# Altium schematic symbol library FPGA_Xilinx_Virtex6.SchLib: 28 symbols (part 1 of 15) (continued)
## XC6VHX255T-FF1155 (continued)
part K pins: A3 MGTTXN2_118, A4 MGTTXP2_118, A7 MGTRXN2_118, A8 MGTRXP2_118, B1 MGTTXN3_118, B2 MGTTXP3_118, B5 MGTRXN3_118, B6 MGTRXP3_118, C3 MGTREFCLKN_118, C4 MGTREFCLKP_118, C7 MGTRXN1_118, C8 MGTRXP1_118, D1 MGTTXN1_118, D2 MGTTXP1_118, E3 MGTTXN0_118, E4 MGTTXP0_118, E7 MGTRXN0_118, E8 MGTRXP0_118, G8 MGTRBIAS_118
part L pins: AA6 MGTAVCC_R, AA29 MGTAVCC_L, AB7 MGTAVCC_R, AB28 MGTAVCC_L, AC2 MGTAVTT_R, AC33 MGTAVTT_L, AD3 MGTAVTT_R, AD7 MGTAVCC_R, AD28 MGTAVCC_L, AD32 MGTAVTT_L, AF7 MGTAVCC_R, AF28 MGTAVCC_L, AG2 MGTAVTT_R, AG33 MGTAVTT_L, AH3 MGTAVTT_R, AH7 MGTAVCC_R, AH28 MGTAVCC_L, AH32 MGTAVTT_L, AK7 MGTAVCC_R, AK28 MGTAVCC_L, AL2 MGTAVTT_R, AL6 MGTAVCC_R, AL29 MGTAVCC_L, AL33 MGTAVTT_L, AM3 MGTAVTT_R, AM7 MGTAVCC_R, AM28 MGTAVCC_L, AM32 MGTAVTT_L, AP5 MGTRREF_115, AP6 MGTAVTTRCAL_115, AP29 MGTAVTTRCAL_105, AP30 MGTRREF_105, W2 MGTAVTT_R, W33 MGTAVTT_L, Y3 MGTAVTT_R, Y32 MGTAVTT_L
part M pins: A1 MGTHAGND, A2 MGTHAGND, A5 MGTHAGND, A6 MGTHAVCCRX, B3 MGTHAGND, B4 MGTHAVCC, B7 MGTHAGND, B8 MGTHAVCCRX, C1 MGTHAGND, C2 MGTHAVTT, C5 MGTHAGND, C6 MGTHAVCCRX, D3 MGTHAGND, D4 MGTHAVCC, D7 MGTHAGND, D8 MGTHAVCCRX, E1 MGTHAGND, E2 MGTHAGND, E5 MGTHAGND, E6 MGTHAVCCRX, F3 MGTHAGND, F4 MGTHAVCC, F7 MGTHAGND, F8 MGTHAVCCPLL, G1 MGTHAGND, G2 MGTHAVTT, G5 MGTHAGND, G6 MGTHAVCC, G7 MGTHAGND, H3 MGTHAGND, H4 MGTHAVCC, H7 MGTHAGND, H8 MGTHAVCCPLL, J1 MGTHAGND, J2 MGTHAGND, J5 MGTHAGND, J6 MGTHAVCCRX, J7 MGTHAGND, K3 MGTHAGND, K4 MGTHAVCC, K7 MGTHAGND, K8 MGTHAVCCPLL, L1 MGTHAGND, L2 MGTHAVTT, L5 MGTHAGND, L6 MGTHAVCCRX, M3 MGTHAGND, M4 MGTHAVCC, M7 MGTHAGND, M8 MGTHAGND, N1 MGTHAGND, N2 MGTHAGND, N5 MGTHAGND, N6 MGTHAVCCRX, P3 MGTHAGND, P4 MGTHAVCC, P7 MGTHAGND, R1 MGTHAGND, R2 MGTHAVTT, R5 MGTHAGND, R6 MGTHAVCC, T3 MGTHAGND, T4 MGTHAVCC, T5 MGTHAGND, T6 MGTHAGND, U1 MGTHAGND, U2 MGTHAGND, U5 MGTHAGND
part N pins: P10 VCCO_0, P25 M1_0, R25 M2_0, T8 DIN_0, T9 INIT_B_0, T25 M0_0, U8 DONE_0, U9 VCCO_0, U10 HSWAPEN_0, U17 VREFN_0, U18 VP_0, U25 PROGRAM_B_0, V9 TDI_0, V17 VN_0, V18 VREFP_0, W8 TCK_0, W9 TDO_0, W10 TMS_0, W17 DXN_0, W18 DXP_0, W25 CSI_B_0, W26 DOUT_BUSY_0, Y10 CCLK_0, Y25 RDWR_B_0
part O pins: A9 GND, A16 GND, A26 GND, AA10 VCCAUX, AA12 VCCINT, AA14 VCCINT, AA16 VCCINT, AA18 VCCINT, AA20 VCCINT, AA22 VCCINT, AA24 VCCAUX, AA25 VFS_0, AB13 VCCINT, AB15 VCCINT, AB17 VCCINT, AB19 VCCINT, AB21 VCCINT, AB23 VCCAUX, B9 GND, B13 GND, B23 GND, B33 GND, C9 GND, C10 GND, C20 GND, C30 GND, D9 GND, D17 GND, D27 GND, E9 GND, E14 GND, E24 GND, E34 GND, F9 GND, F11 GND, F21 GND, F31 GND, G9 GND, G18 GND, G28 GND, H9 GND, H15 GND, H25 GND, J9 GND, J12 GND, J22 GND, J32 GND, K9 GND, K19 GND, K29 GND, L9 GND, L16 GND, L26 GND, M9 GND, M13 GND, M23 GND, M33 GND, N9 GND, N10 GND, N12 VCCINT, N13 GND, N14 VCCINT, N15 GND, N16 VCCINT, N18 VCCINT, N19 GND, N20 VCCINT, N21 GND, N22 VCCINT, N23 GND, N24 VCCAUX, N30 GND, P8 GND, P9 GND, P11 VCCAUX, P12 GND, P13 VCCINT, P14 GND, P15 VCCINT, P16 GND, P17 VCCINT, P18 GND, P19 VCCINT, P20 GND, P21 VCCINT, P22 GND, P23 VCCINT, P24 GND, P27 GND, R7 GND, R8 GND, R9 VBATT_0, R10 VCCAUX, R11 GND, R12 VCCINT, R13 GND, R14 VCCINT, R15 GND, R16 VCCINT, R17 GND, R18 VCCINT, R19 GND, R20 VCCINT, R21 GND, R22 VCCINT, R23 GND, R24 VCCAUX, R34 GND, T7 GND, T10 GND, T11 VCCAUX, T12 GND, T13 VCCINT, T14 GND, T15 VCCINT, T16 GND, T17 AVSS_0, T18 AVDD_0, T19 VCCINT, T20 GND, T21 VCCINT, T22 GND, T23 VCCINT, T24 GND, T31 GND, U6 GND, U7 GND, U11 GND, U12 VCCINT, U13 GND, U14 VCCINT, U15 GND, U16 VCCINT, U19 GND, U20 VCCINT, U21 GND, U22 VCCINT, U23 GND, U24 VCCAUX, U28 GND, U32 GND, U33 GND, U34 GND, V3 GND, V4 GND, V5 GND, V6 GND, V7 GND, V8 GND, V10 GND, V11 VCCAUX, V12 GND, V13 VCCINT, V14 GND, V15 VCCINT, V19 VCCINT, V21 VCCINT, V23 VCCINT, W12 VCCINT, W14 VCCINT, W16 VCCINT, W20 VCCINT, W22 VCCINT, W24 VCCAUX, Y11 VCCAUX, Y13 VCCINT, Y15 VCCINT, Y17 VCCINT, Y19 VCCINT, Y21 VCCINT, Y23 VCCINT
part P pins: AA1 GND, AA2 GND, AA5 GND, AA9 GND, AA11 GND, AA13 GND, AA15 GND, AA17 GND, AA19 GND, AA21 GND, AA23 GND, AA26 GND, AA30 GND, AA33 GND, AA34 GND, AB3 GND, AB4 GND, AB8 GND, AB9 GND, AB12 GND, AB14 GND, AB16 GND, AB18 GND, AB20 GND, AB22 GND, AB25 GND, AB26 GND, AB27 GND, AB31 GND, AB32 GND, AC1 GND, AC5 GND, AC6 GND, AC9 GND, AC10 GND, AC20 GND, AC26 GND, AC29 GND, AC30 GND, AC34 GND, AD4 GND, AD8 GND, AD9 GND, AD17 GND, AD26 GND, AD27 GND, AD31 GND, AE1 GND, AE2 GND, AE5 GND, AE6 GND, AE9 GND, AE14 GND, AE24 GND, AE26 GND, AE29 GND, AE30 GND, AE33 GND, AE34 GND, AF3 GND, AF4 GND, AF8 GND, AF9 GND, AF11 GND, AF21 GND, AF26 GND, AF27 GND, AF31 GND, AF32 GND, AG1 GND, AG5 GND, AG6 GND, AG9 GND, AG18 GND, AG26 GND, AG29 GND, AG30 GND, AG34 GND, AH4 GND, AH8 GND, AH9 GND, AH15 GND, AH25 GND, AH26 GND, AH27 GND, AH31 GND, AJ1 GND, AJ2 GND, AJ5 GND, AJ6 GND, AJ9 GND, AJ12 GND, AJ22 GND, AJ26 GND, AJ29 GND, AJ30 GND, AJ33 GND, AJ34 GND, AK3 GND, AK4 GND, AK8 GND, AK9 GND, AK19 GND, AK26 GND, AK27 GND, AK31 GND, AK32 GND, AL1 GND, AL5 GND, AL9 GND, AL16 GND, AL26 GND, AL30 GND, AL34 GND, AM4 GND, AM8 GND, AM9 GND, AM13 GND, AM23 GND, AM26 GND, AM27 GND, AM31 GND, AN1 GND, AN2 GND, AN5 GND, AN6 GND, AN7 GND, AN8 GND, AN10 GND, AN20 GND, AN27 GND, AN28 GND, AN29 GND, AN30 GND, AN33 GND, AN34 GND, AP3 GND, AP4 GND, AP7 GND, AP8 GND, AP17 GND, AP27 GND, AP28 GND, AP31 GND, AP32 GND, V16 GND, V20 GND, V22 GND, V24 GND, V25 GND, V30 GND, V31 GND, V32 GND, W1 GND, W5 GND, W6 GND, W7 GND, W11 GND, W13 GND, W15 GND, W19 GND, W21 GND, W23 GND, W28 GND, W29 GND, W30 GND, W34 GND, Y4 GND, Y7 GND, Y8 GND, Y9 GND, Y12 GND, Y14 GND, Y16 GND, Y18 GND, Y20 GND, Y22 GND, Y24 GND, Y26 GND, Y27 GND, Y28 GND, Y31 GND

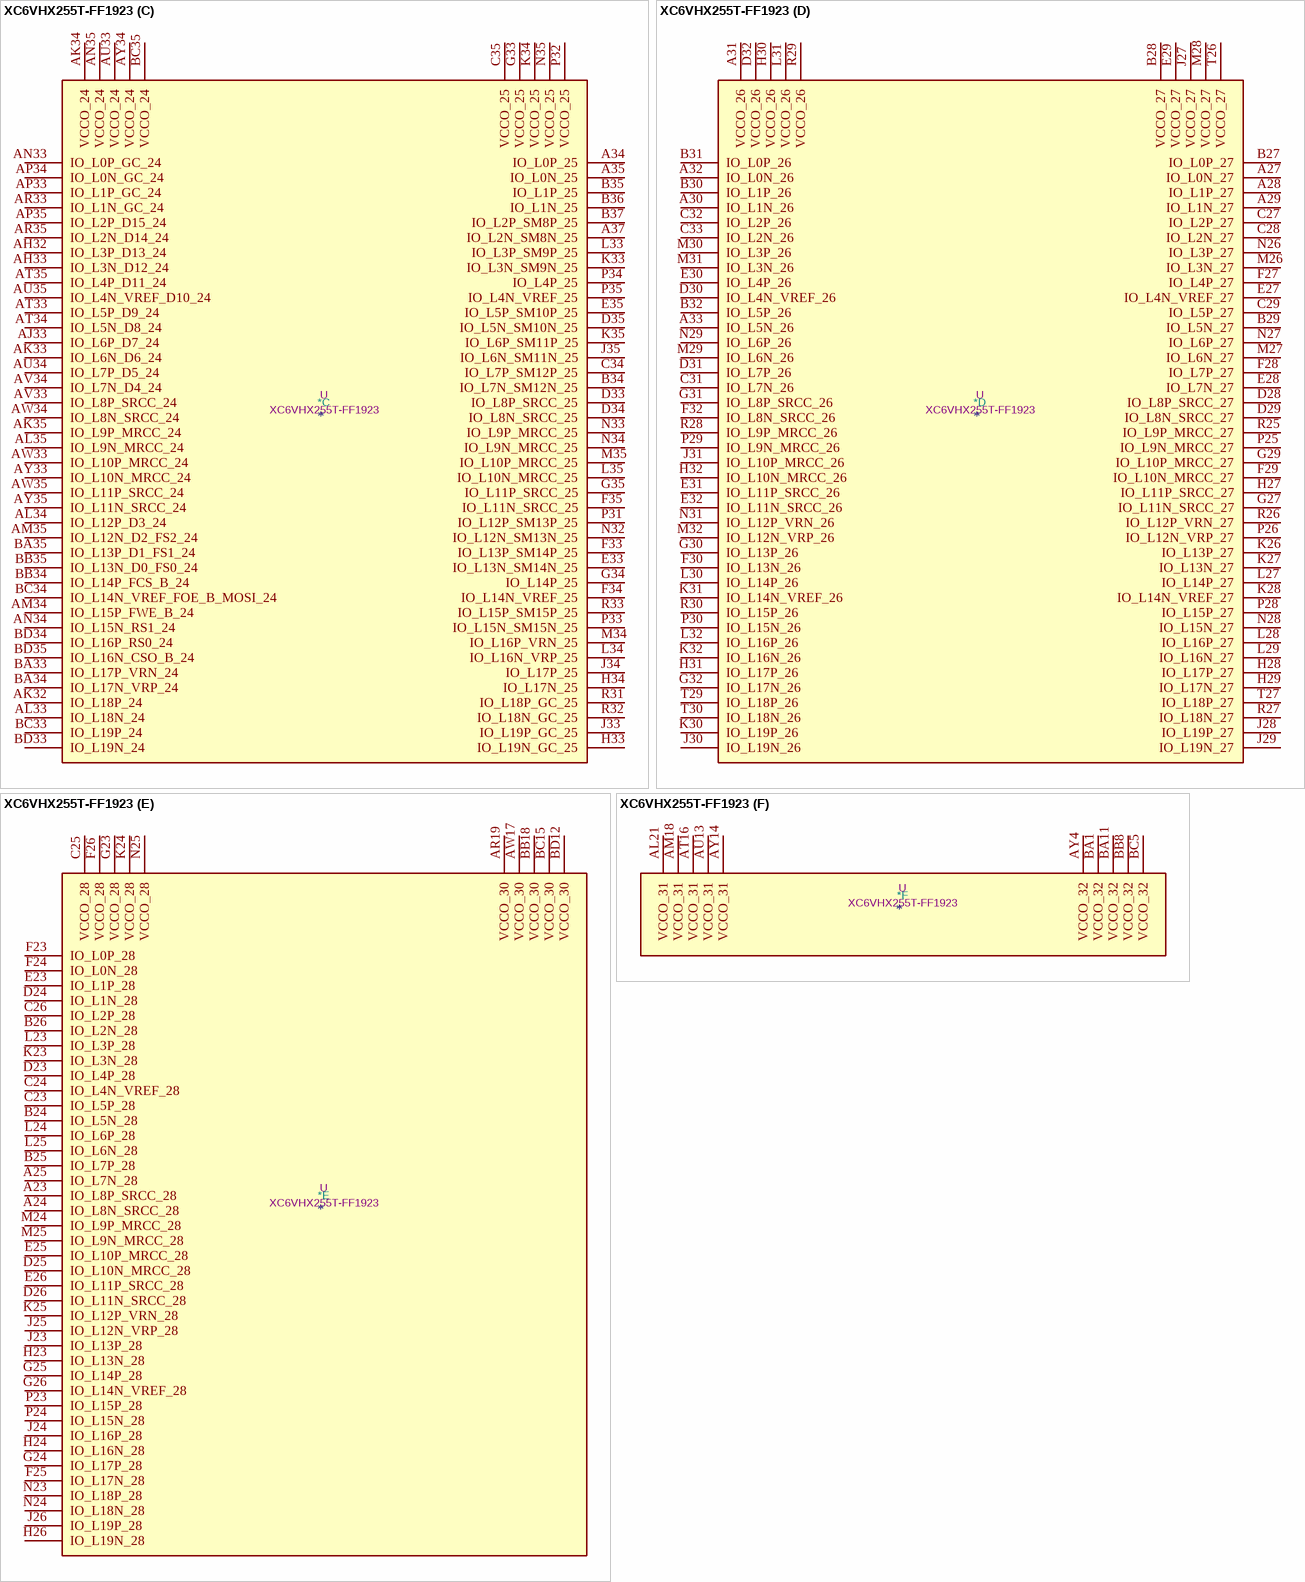
[diagram p6: symbol XC6VHX255T-FF1923]

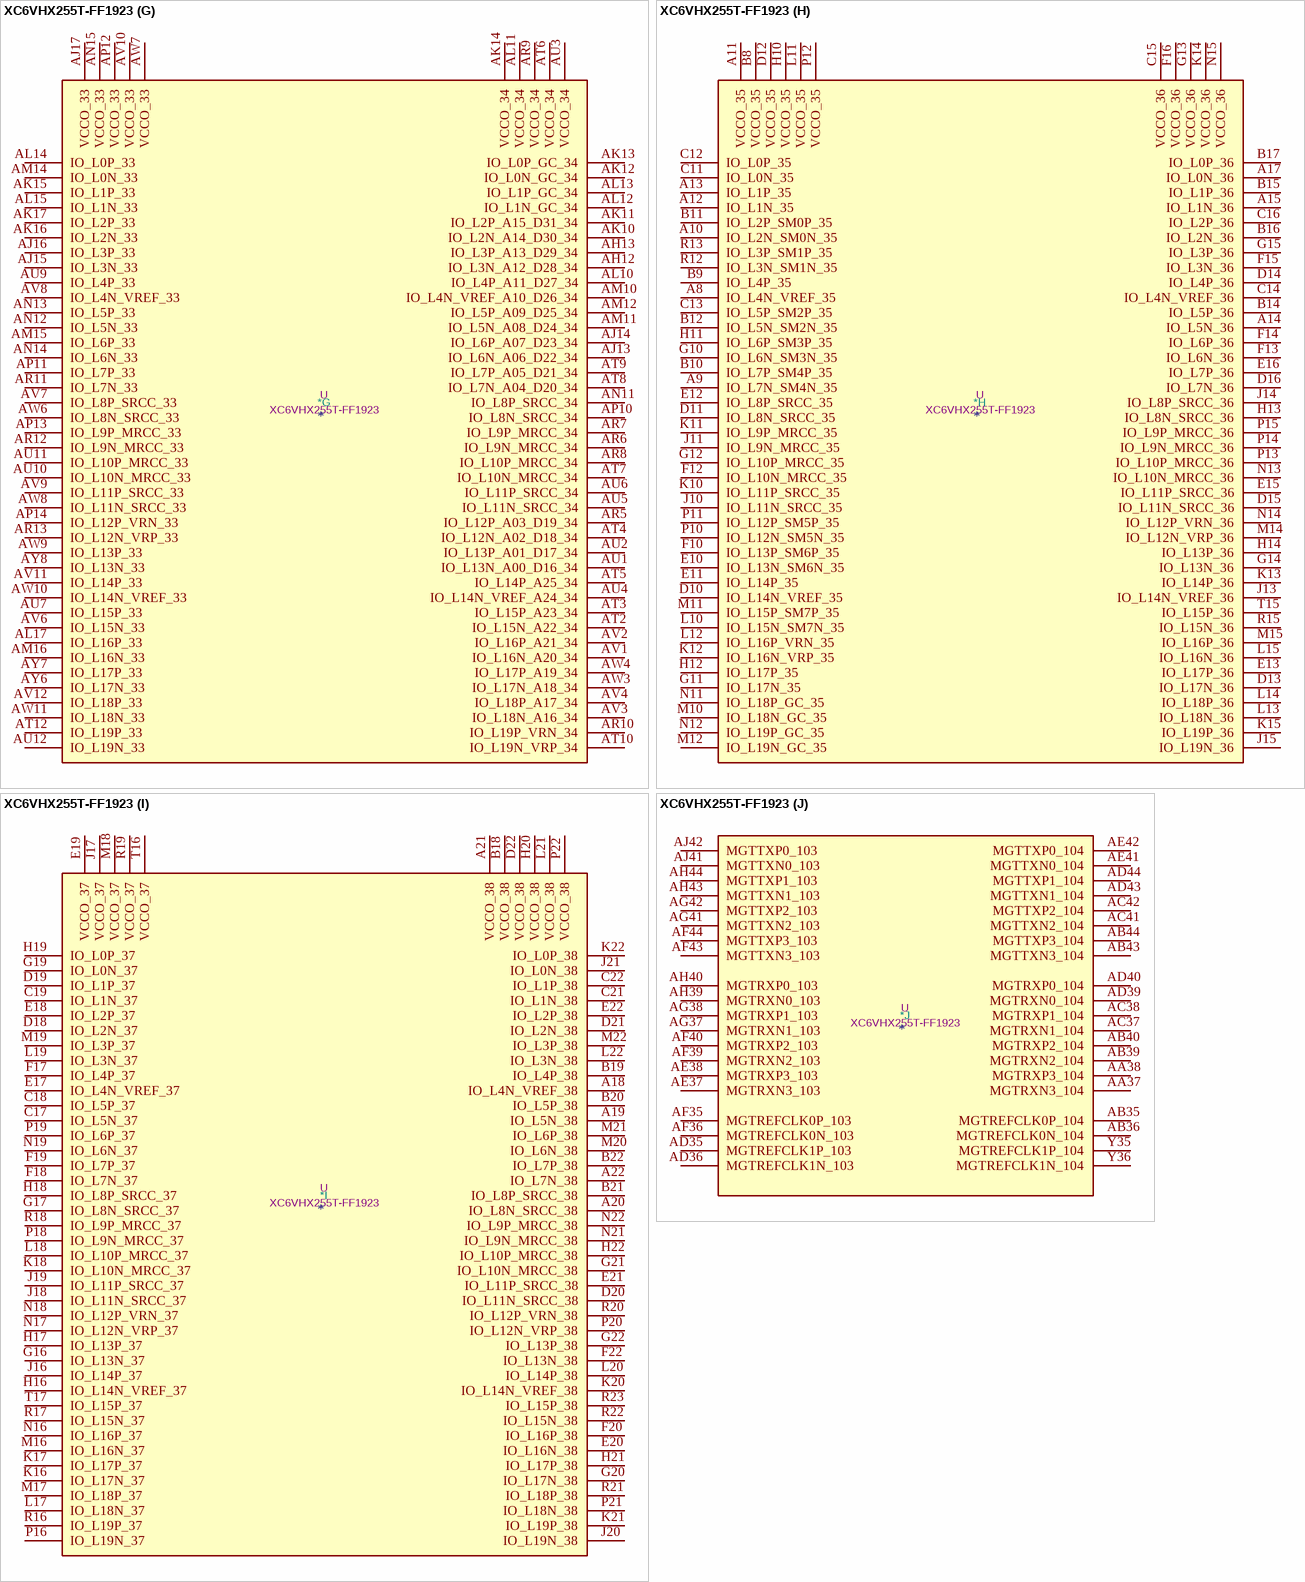
[diagram p7: symbol XC6VHX255T-FF1923]

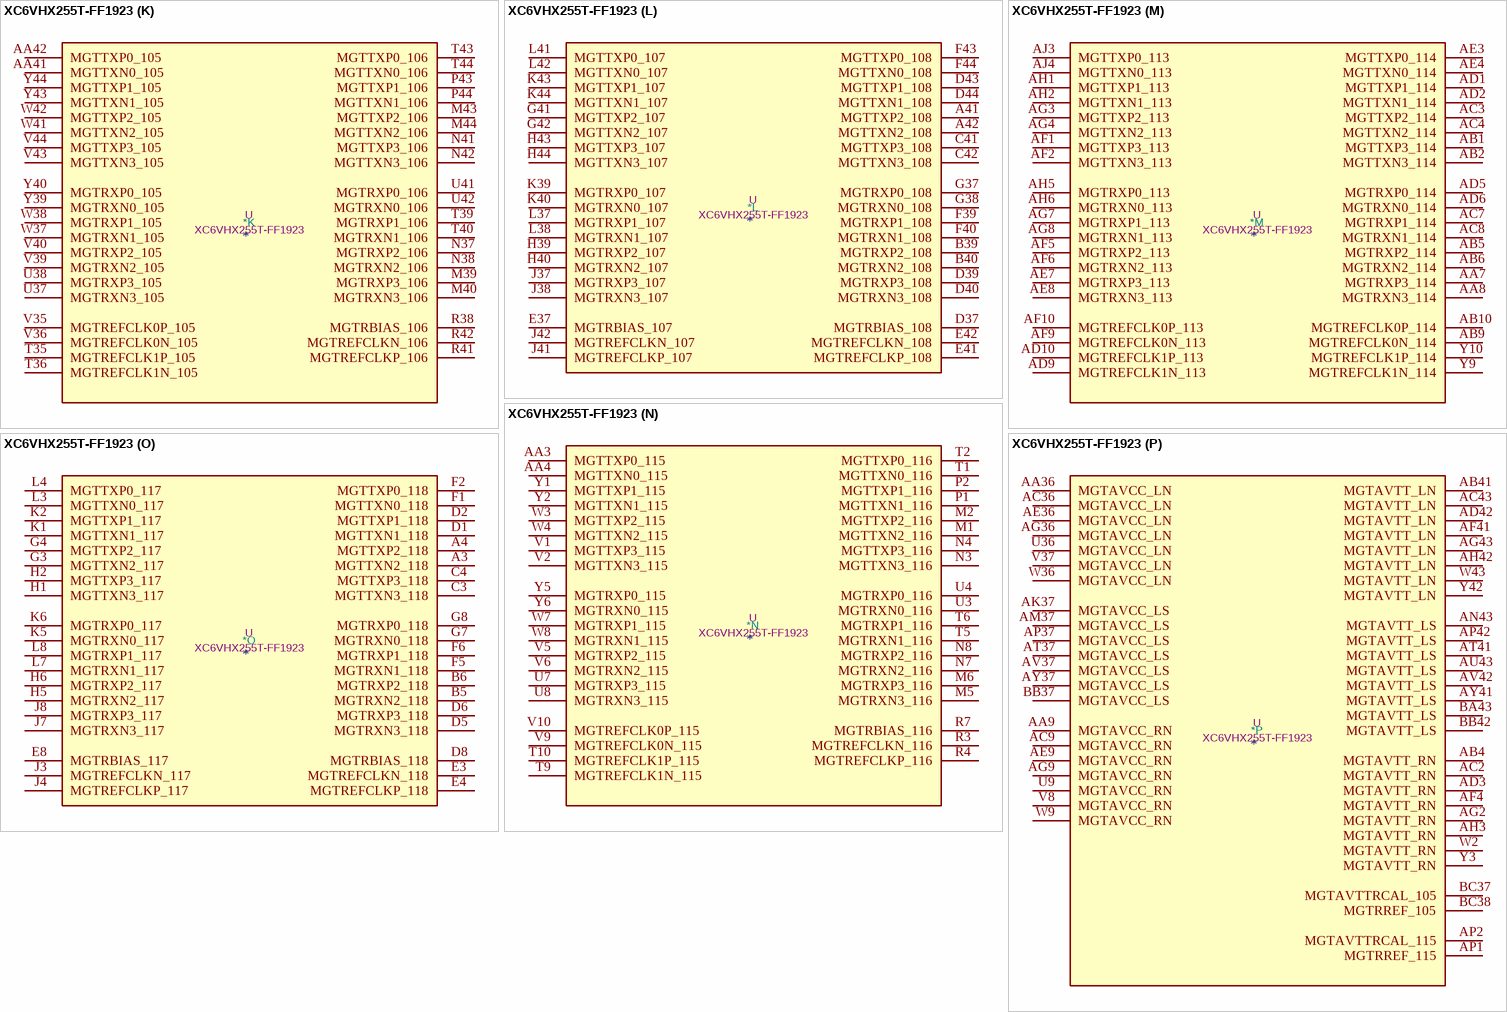
[diagram p8: symbol XC6VHX255T-FF1923]

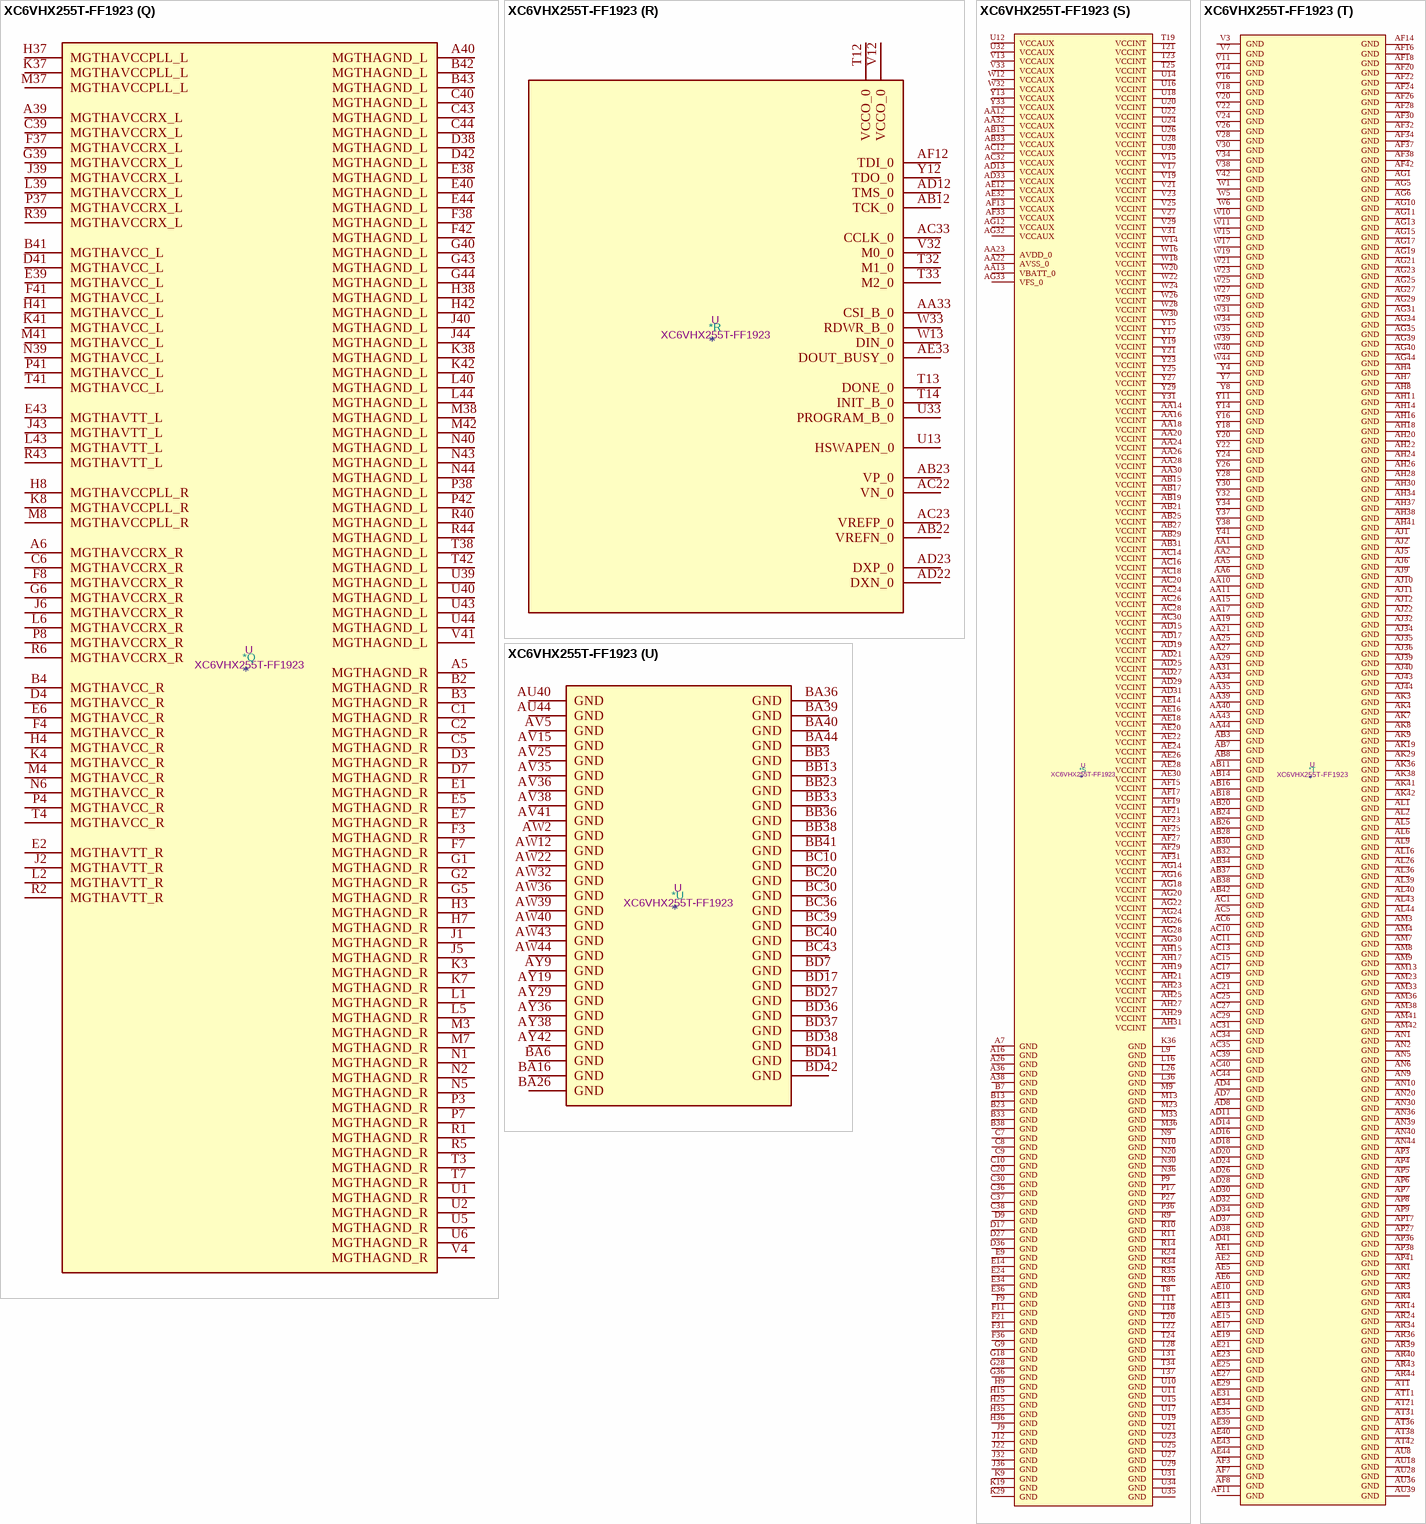
[diagram p9: symbol XC6VHX255T-FF1923]